# Altium footprint library DipComponent.PcbLib: 303 footprints (part 16 of 19)
Each footprint in its own frame and in the unit in brackets; x right, y up, seen from the top. Pads: shape width x height; smd on the part's side, far side on the other; paste and mask are expansions set on the pad; w line width, h text height; cw(c..) or ccw(c..) is an arc to the next point about the centre after c.
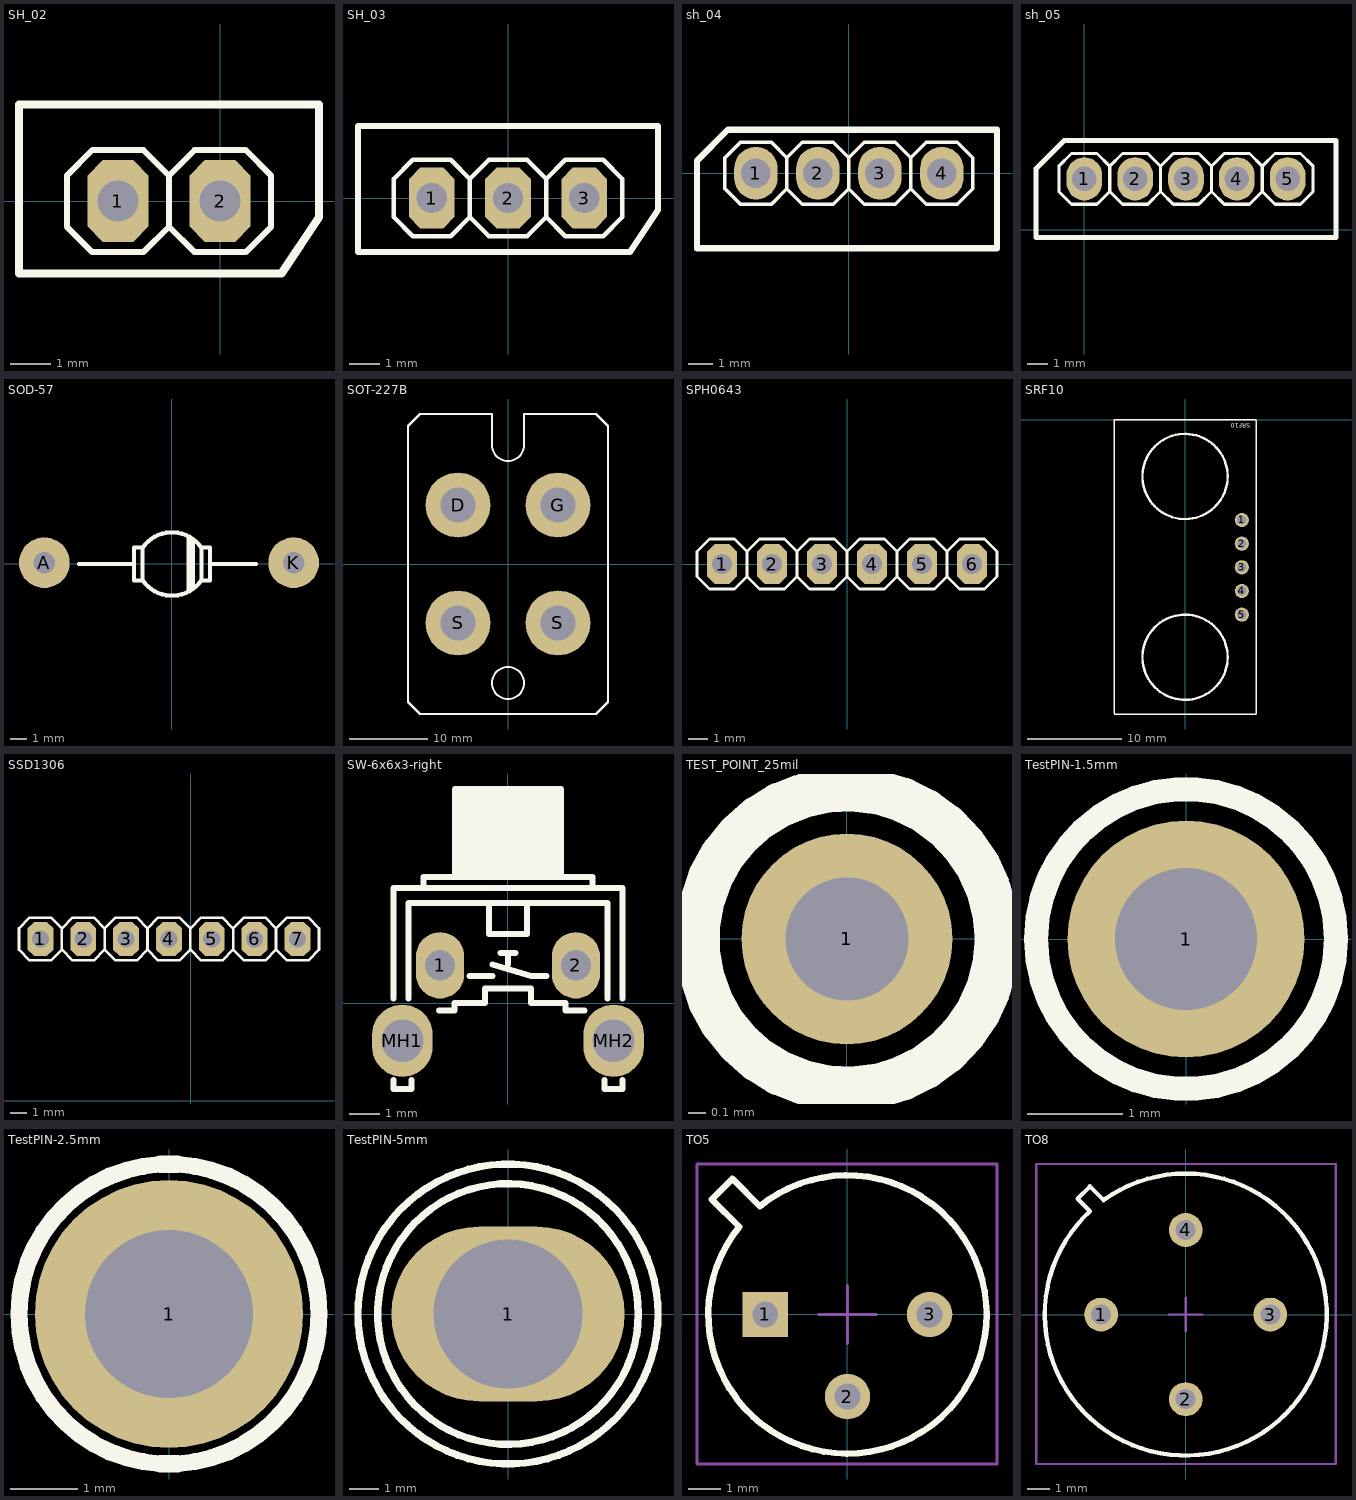
[diagram p15: the footprints below, top view; thin cyan lines are the x and y axes]

## SH_02 [mil]
pads (2):
  oct 60x80 hole 40: 1(-100,0) 2(0,0)
Top Overlay:
  rectangle: -110,-10 -90,10
  rectangle: -10,-10 10,10
  lines w6: -50,-25 -25,-50 25,-50 50,-25 50,25 25,50 -25,50 -50,25 ; -50,-25 -75,-50 -125,-50 -150,-25 -150,25 -125,50 -75,50 -50,25 ; -50,-25 -50,25
  lines w7.87: -196.85,-70.87 60.1,-70.87 96.85,-15.75 96.85,94.49 -196.85,94.49 -196.85,-70.87

## SH_03 [mil]
pads (3):
  oct 60x80 hole 40: 1(-100,0) 2(0,0) 3(100,0)
Top Overlay:
  rectangle: -10,-10 10,10
  rectangle: -110,-10 -90,10
  rectangle: 90,-10 110,10
  lines w6: -50,-25 -50,25 ; -50,-25 -75,-50 -125,-50 -150,-25 -150,25 -125,50 -75,50 -50,25 ; -50,-25 -25,-50 25,-50 50,-25 ; -50,25 -25,50 25,50 50,25 ; 50,-25 50,25 ; 50,-25 75,-50 125,-50 150,-25 150,25 125,50 75,50 50,25
  lines w7.87: -196.85,-70.87 -196.85,94.49 196.85,94.49 196.85,-15.75 160.1,-70.87 149.61,-70.87 -196.85,-70.87
3D body "pingerd.STEP": height 242.86, standoff -136.91, extent -197.61,-70.87 197.61,94.65

## sh_04 [mil] "wtb 2.54"
pads (4):
  oval 70x85 hole 48: 1(-150,0) 2(-50,0) 3(50,0) 4(150,0)
Top Overlay:
  lines w6: -100,-25 -100,25 ; -100,-25 -125,-50 -175,-50 -200,-25 -200,25 -175,50 -125,50 -100,25 ; -100,-25 -75,-50 -25,-50 0,-25 ; -100,25 -75,50 -25,50 0,25 ; 0,-25 0,25 ; 0,-25 25,-50 75,-50 100,-25 ; 0,25 25,50 75,50 100,25 ; 100,-25 100,25 ; 100,-25 125,-50 175,-50 200,-25 200,25 175,50 125,50 100,25
  lines w10: -245,-121 239.09,-121 239.09,70 -195,70 -245,20 -245,-121
3D body "WTB-sh-04.stp": height 234.25, standoff -135.83, extent -245.09,-121.24 243.09,71.67

## sh_05 [mil] "wtb 2.54."
pads (5):
  oval 70x85 hole 48: 1(0,100) 2(100,100) 3(200,100) 4(300,100) 5(400,100)
Top Overlay:
  lines w6: 50,75 50,125 ; 50,75 25,50 -25,50 -50,75 -50,125 -25,150 25,150 50,125 ; 50,75 75,50 125,50 150,75 ; 50,125 75,150 125,150 150,125 ; 150,75 150,125 ; 150,75 175,50 225,50 250,75 ; 150,125 175,150 225,150 250,125 ; 250,75 250,125 ; 250,75 275,50 325,50 350,75 ; 250,125 275,150 325,150 350,125 ; 350,75 350,125 ; 350,75 375,50 425,50 450,75 450,125 425,150 375,150 350,125
  lines w10: -95,-15 495,-15 495,175 -40,175 -95,120 -95,-15
3D body "WTB-sh05.stp": height 234.25, standoff -135.83, extent -93.3,-17.24 493.31,175.68

## SOD-57 [mil]
pads (2):
  round 120 hole 51.18: A(-302,3) K(288,3)
Top Overlay:
  lines w10: -220,0 -90,0 ; 40,-65 40,65 ; 45,-60 45,60 ; 50,-55 50,55 ; 90,0 199,0 ; -69.63,-38.75 ccw(c0,10) 69.63,-38.75 ; -69.63,-38.75 -69.63,38.75 ; -69.63,-38.75 -90,-38.75 -90,38.75 -69.63,38.75 ; -69.63,38.75 cw(c0,-10) 69.63,38.75 ; 69.63,-38.75 69.63,38.75 ; 69.63,-38.75 90,-38.75 90,38.75 69.63,38.75
3D body "User Library-BYV28-200_.STEP": height 206.69, standoff -78.74, extent -327.85,-84.57 315.85,92.59

## SOT-227B [mil]
pads (4):
  round 325 / inner round 325 / far side rect 450x325 hole 177.16: D(-250,295) G(250,295) S(-250,-295) S(250,-295)
Top Overlay:
  circle w10: c0,-595 r80
  lines w10: -500,-690 -500,690 -440,750 -80,750 -80,595 ccw(c0,595) 80,595 80,750 440,750 500,690 500,-690 440,-750 -440,-750 -500,-690

## SPH0643 [mil]
pads (6):
  oct 60x80 hole 40: 1(-250,0) 2(-150,0) 3(-50,0) 4(50,0) 5(150,0) 6(250,0)
Top Overlay:
  rectangle: 240,-10 260,10
  rectangle: -260,-10 -240,10
  rectangle: -160,-10 -140,10
  rectangle: -60,-10 -40,10
  rectangle: 40,-10 60,10
  rectangle: 140,-10 160,10
  lines w6: -200,-25 -175,-50 -125,-50 -100,-25 ; -200,-25 -225,-50 -275,-50 -300,-25 -300,25 -275,50 -225,50 -200,25 ; -200,-25 -200,25 ; -200,25 -175,50 -125,50 -100,25 ; -100,-25 -100,25 ; -100,-25 -75,-50 -25,-50 0,-25 ; -100,25 -75,50 -25,50 0,25 ; 0,-25 25,-50 75,-50 100,-25 ; 0,-25 0,25 ; 0,25 25,50 75,50 100,25 ; 100,-25 125,-50 175,-50 200,-25 ; 100,-25 100,25 ; 100,25 125,50 175,50 200,25 ; 200,-25 225,-50 275,-50 300,-25 300,25 275,50 225,50 200,25 ; 200,-25 200,25
3D body "User Library-Header Vertical 2_54mm Pitch2-16 Way.STEP": height 233.86, standoff -115.75, extent -300,-51.18 300,48.82

## SRF10 [mm]
pads (5):
  round 1.5 hole 1: 1(6,-10.6) 2(6,-13.1) 3(6,-15.6) 4(6,-18.1) 5(6,-20.6)
Top Overlay:
  circle w0.254: c0,-25.1 r4.5
  circle w0.254: c0,-6 r4.5
  lines w0.15: -7.5,-31.1 7.5,-31.1 7.5,-0.1 ; -7.5,-31 -7.5,0 7.5,0
  text "SRF10" at 6.9,-0.2 h0.8
3D body: height 9, standoff 2, extent -4.464,-29.641 4.5,-20.659
3D body: height 9, standoff 2, extent -4.464,-10.491 4.5,-1.509
3D body: height 2, standoff 0.4, extent -7.45,-31.15 7.55,-0.05

## SSD1306 [mil]
pads (7):
  oct 60x80 hole 40: 1(-350.39,377.95) 2(-250.39,377.95) 3(-150.39,377.95) 4(-50.39,377.95) 5(49.61,377.95) 6(149.61,377.95) 7(250,377.95)
Top Overlay:
  rectangle: 139.61,367.95 159.61,387.95
  rectangle: -360.39,367.95 -340.39,387.95
  rectangle: -260.39,367.95 -240.39,387.95
  rectangle: -160.39,367.95 -140.39,387.95
  rectangle: -60.39,367.95 -40.39,387.95
  rectangle: 39.61,367.95 59.61,387.95
  rectangle: 240,367.95 260,387.95
  lines w6: -300.39,352.95 -275.39,327.95 -225.39,327.95 -200.39,352.95 ; -300.39,352.95 -325.39,327.95 -375.39,327.95 -400.39,352.95 -400.39,402.95 -375.39,427.95 -325.39,427.95 -300.39,402.95 ; -300.39,352.95 -300.39,402.95 ; -300.39,402.95 -275.39,427.95 -225.39,427.95 -200.39,402.95 ; -200.39,352.95 -200.39,402.95 ; -200.39,352.95 -175.39,327.95 -125.39,327.95 -100.39,352.95 ; -200.39,402.95 -175.39,427.95 -125.39,427.95 -100.39,402.95 ; -100.39,352.95 -75.39,327.95 -25.39,327.95 -0.39,352.95 ; -100.39,352.95 -100.39,402.95 ; -100.39,402.95 -75.39,427.95 -25.39,427.95 -0.39,402.95 ; -0.39,352.95 24.61,327.95 74.61,327.95 99.61,352.95 ; -0.39,352.95 -0.39,402.95 ; -0.39,402.95 24.61,427.95 74.61,427.95 99.61,402.95 ; 99.61,352.95 124.61,327.95 174.61,327.95 199.61,352.95 199.61,402.95 174.61,427.95 124.61,427.95 99.61,402.95 ; 99.61,352.95 99.61,402.95 ; 200,352.95 200,402.95 225,427.95 275,427.95 300,402.95 300,352.95 275,327.95 225,327.95 200,352.95
3D body "User Library-128x64I2COLEDDisplayAdafruit.STEP": height 451.69, standoff 24.69, extent -566.93,-624.41 484.25,472.44

## SW-6x6x3-right [mm]
pads (4):
  oval 1.6x2.2 hole 1 mask+0.1: 1(-2.25,1.25) 2(2.25,1.25)
  oval 2x2.4 hole 1.4 mask+0.1: MH1(-3.5,-1.25) MH2(3.5,-1.25)
Top Overlay:
  region: 1.75,7.092 -1.75,7.092 -1.75,4.171 1.75,4.171
  lines w0.2: -3.8,-2.55 -3.8,-2.85 -3.2,-2.85 -3.2,-2.55 ; -3.8,0.15 -3.8,3.815 -2.794,3.815 ; -3.3,0.15 -3.3,3.307 -0.635,3.307 ; -2.286,-0.249 -1.778,-0.249 -1.778,0.005 -0.762,0.005 -0.762,0.488 0.762,0.488 0.762,0.005 1.905,0.005 1.905,-0.249 2.54,-0.249 ; -1.27,0.894 -0.508,0.894 ; -0.508,1.275 0.762,0.894 1.27,0.894 ; -0.254,1.656 0,1.656 ; 0,1.275 0,1.656 ; 0.254,1.656 0,1.656 ; 2.794,3.815 2.794,4.171 1.75,4.171 ; 3.2,-2.55 3.2,-2.85 3.8,-2.85 3.8,-2.55 ; 3.3,0.15 3.3,3.307 0.635,3.307 ; 3.8,0.15 3.8,3.815 -2.794,3.815 ; -2.794,3.815 -2.794,4.171 -1.75,4.171 ; -1.75,4.171 -1.75,7.092 1.75,7.092 1.75,4.171 ; -1.75,4.171 1.75,4.171 ; -0.635,3.307 -0.635,2.291 0.635,2.291 0.635,3.307 ; -0.635,3.307 0.635,3.307
3D body "SKHHLU.STEP": height 7.43, standoff -3.47, extent -4.248,-2.792 4.248,7.108

## TEST_POINT_25mil [mm]
pads (1):
  round 1.2 hole 0.7: 1(0,0)
Top Overlay:
  circle w0.254: c0,0 r0.854

## TestPIN-1.5mm [mm]
pads (1):
  round 2.5 hole 1.5: 1(0,0)
Top Overlay:
  circle w0.254: c0,0 r1.581

## TestPIN-2.5mm [mm]
pads (1):
  round 4 hole 2.5: 1(0,0)
Top Overlay:
  circle w0.254: c0,0 r2.236

## TestPIN-5mm [mm]
pads (1):
  oval 8x6 hole 5.1 unplated: 1(0,0)
Top Overlay:
  circle w0.254: c0,0 r5.148
  circle w0.254: c0,0 r4.472

## TO5 [mm] "Can; 3 Leads; Pin Circle Dia. 5.08 mm; Lead Dia. 0.48 mm (max)"
height 4.7
pads (3):
  rect 1.4x1.4 hole 0.8: 1(-2.54,0)
  round 1.4 hole 0.8: 2(0,-2.54) 3(2.54,0)
Top Overlay:
  lines w0.2: -4.191,3.554 -3.342,2.706 ccw(c0,0) -2.706,3.342 -3.554,4.19 -4.19,3.554
Mechanical 13:
  lines w0.1: -4.216,3.556 -3.581,4.191 -2.733,3.366 cw(c0,0) -3.378,2.718 -4.216,3.556
Mechanical 15:
  lines w0.1: -0.889,0 0.889,0 ; 0,-0.889 0,0.889 ; -4.648,-4.623 4.623,-4.623 4.623,4.648 -4.648,4.648 -4.648,-4.623
3D body: height 4.7, standoff 0, extent -4.301,-4.311 4.301,4.306

## TO8 [mil] "Can; 4 Leads; Pin Circle Dia. 7.62 mm; Lead Dia. 0.48 mm (max)"
height 270
pads (4):
  round 60 hole 35.43: 1(-150,0) 2(0,-150) 3(150,0) 4(0,150)
Top Overlay:
  lines w7.87: -145.83,203.06 cw(c0,0) -169.86,183.43 -191.78,205.35 -169.86,227.27 -145.74,203.15
Mechanical 13:
  lines w3.94: -145.83,203.06 cw(c0,0) -169.86,183.43 -191.78,205.35 -169.86,227.27 -145.74,203.15
Mechanical 15:
  lines w3.94: -30,0 0,0 ; 0,-30 0,0 ; 0,30 0,0 ; 30,0 0,0 ; -265,-265 -265,267 266,267 266,-265 -265,-265
3D body: height 270, standoff 0, extent -250.46,-250.44 250.02,250.35